# Altium footprint library STM32.PcbLib: 1 footprints
Each footprint in its own frame and in the unit in brackets; x right, y up, seen from the top. Pads: shape width x height; smd on the part's side, far side on the other; paste and mask are expansions set on the pad; w line width, h text height; cw(c..) or ccw(c..) is an arc to the next point about the centre after c.
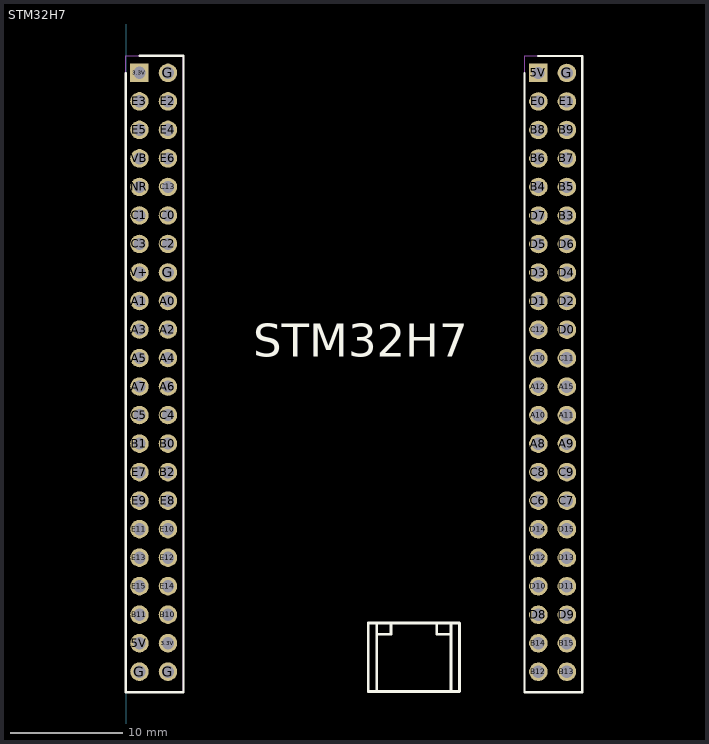
[diagram p0: the footprint, top view; thin cyan lines are the x and y axes]

## STM32H7 [mm]
pads (88):
  rect 1.65x1.65 / inner round 1.65 / far side rect 1.65x1.65 hole 1.1: 3.3V(1.166,60.02) 5V(36.696,60.015)
  round 1.65 hole 1.1: 3.3V(3.706,9.22) 5V(1.166,9.22) A0(3.706,39.7) A1(1.166,39.7) A2(3.706,37.16) A3(1.166,37.16) A4(3.706,34.62) A5(1.166,34.62) A6(3.706,32.08) A7(1.166,32.08) A8(36.696,26.995) A9(39.236,26.995) A10(36.696,29.535) A11(39.236,29.535) A12(36.696,32.075) A15(39.236,32.075) B0(3.706,27) B1(1.166,27) B2(3.706,24.46) B3(39.236,47.315) B4(36.696,49.855) B5(39.236,49.855) B6(36.696,52.395) B7(39.236,52.395) B8(36.696,54.935) B9(39.236,54.935) B10(3.706,11.76) B11(1.166,11.76) B12(36.696,6.675) B13(39.236,6.675) B14(36.696,9.215) B15(39.236,9.215) C0(3.706,47.32) C1(1.166,47.32) C2(3.706,44.78) C3(1.166,44.78) C4(3.706,29.54) C5(1.166,29.54) C6(36.696,21.915) C7(39.236,21.915) C8(36.696,24.455) C9(39.236,24.455) C10(36.696,34.615) C11(39.236,34.615) C12(36.696,37.155) C13(3.706,49.86) D0(39.236,37.155) D1(36.696,39.695) D2(39.236,39.695) D3(36.696,42.235) D4(39.236,42.235) D5(36.696,44.775) D6(39.236,44.775) D7(36.696,47.315) D8(36.696,11.755) D9(39.236,11.755) D10(36.696,14.295) D11(39.236,14.295) D12(36.696,16.835) D13(39.236,16.835) D14(36.696,19.375) D15(39.236,19.375) E0(36.696,57.475) E1(39.236,57.475) E2(3.706,57.48) E3(1.166,57.48) E4(3.706,54.94) E5(1.166,54.94) E6(3.706,52.4) E7(1.166,24.46) E8(3.706,21.92) E9(1.166,21.92) E10(3.706,19.38) E11(1.166,19.38) E12(3.706,16.84) E13(1.166,16.84) E14(3.706,14.3) E15(1.166,14.3) G(1.166,6.68) G(3.706,6.68) G(3.706,42.24) G(3.706,60.02) G(39.236,60.015) NR(1.166,49.86) V+(1.166,42.24) VB(1.166,52.4)
Top Overlay:
  lines w0.2: -0.064,4.855 5.086,4.855 ; -0.064,4.86 -0.064,60.02 ; 1.166,61.54 5.086,61.54 5.086,4.86 ; 35.466,60.015 35.466,4.855 40.616,4.855 40.616,61.535 36.696,61.535
  lines w0.254: 22.308,4.929 22.308,11.025 ; 22.308,10.009 23.578,10.009 23.578,11.025 ; 27.642,11.025 27.642,10.009 28.912,10.009 ; 28.912,4.929 28.912,11.025 ; 21.546,4.929 29.674,4.929 29.674,5.945 29.674,11.025 21.546,11.025 21.546,5.945 21.546,4.929
  text "STM32H7" at 11.296,33.733 h5
Mechanical 15:
  lines w0.1: -0.064,4.86 -0.064,61.54 5.086,61.54 5.086,4.86 -0.064,4.86 ; 35.466,4.855 35.466,61.535 40.616,61.535 40.616,4.855 35.466,4.855
3D body "BLG2X22.stp": height 8.65, standoff -3.4, extent -0.064,5.16 4.936,61.54
3D body "BLG2X22.stp": height 8.65, standoff -3.4, extent 35.466,5.155 40.466,61.535
3D body "STM32H7xx CoreBoard WeAct Studio V12.step": height 13.25, standoff 6.27, extent -0.127,-0.127 40.513,66.753